# Altium footprint library PCB_Lib_Devzone.PcbLib: 491 footprints (part 13 of 31)
Each footprint in its own frame and in the unit in brackets; x right, y up, seen from the top. Pads: shape width x height; smd on the part's side, far side on the other; paste and mask are expansions set on the pad; w line width, h text height; cw(c..) or ccw(c..) is an arc to the next point about the centre after c.
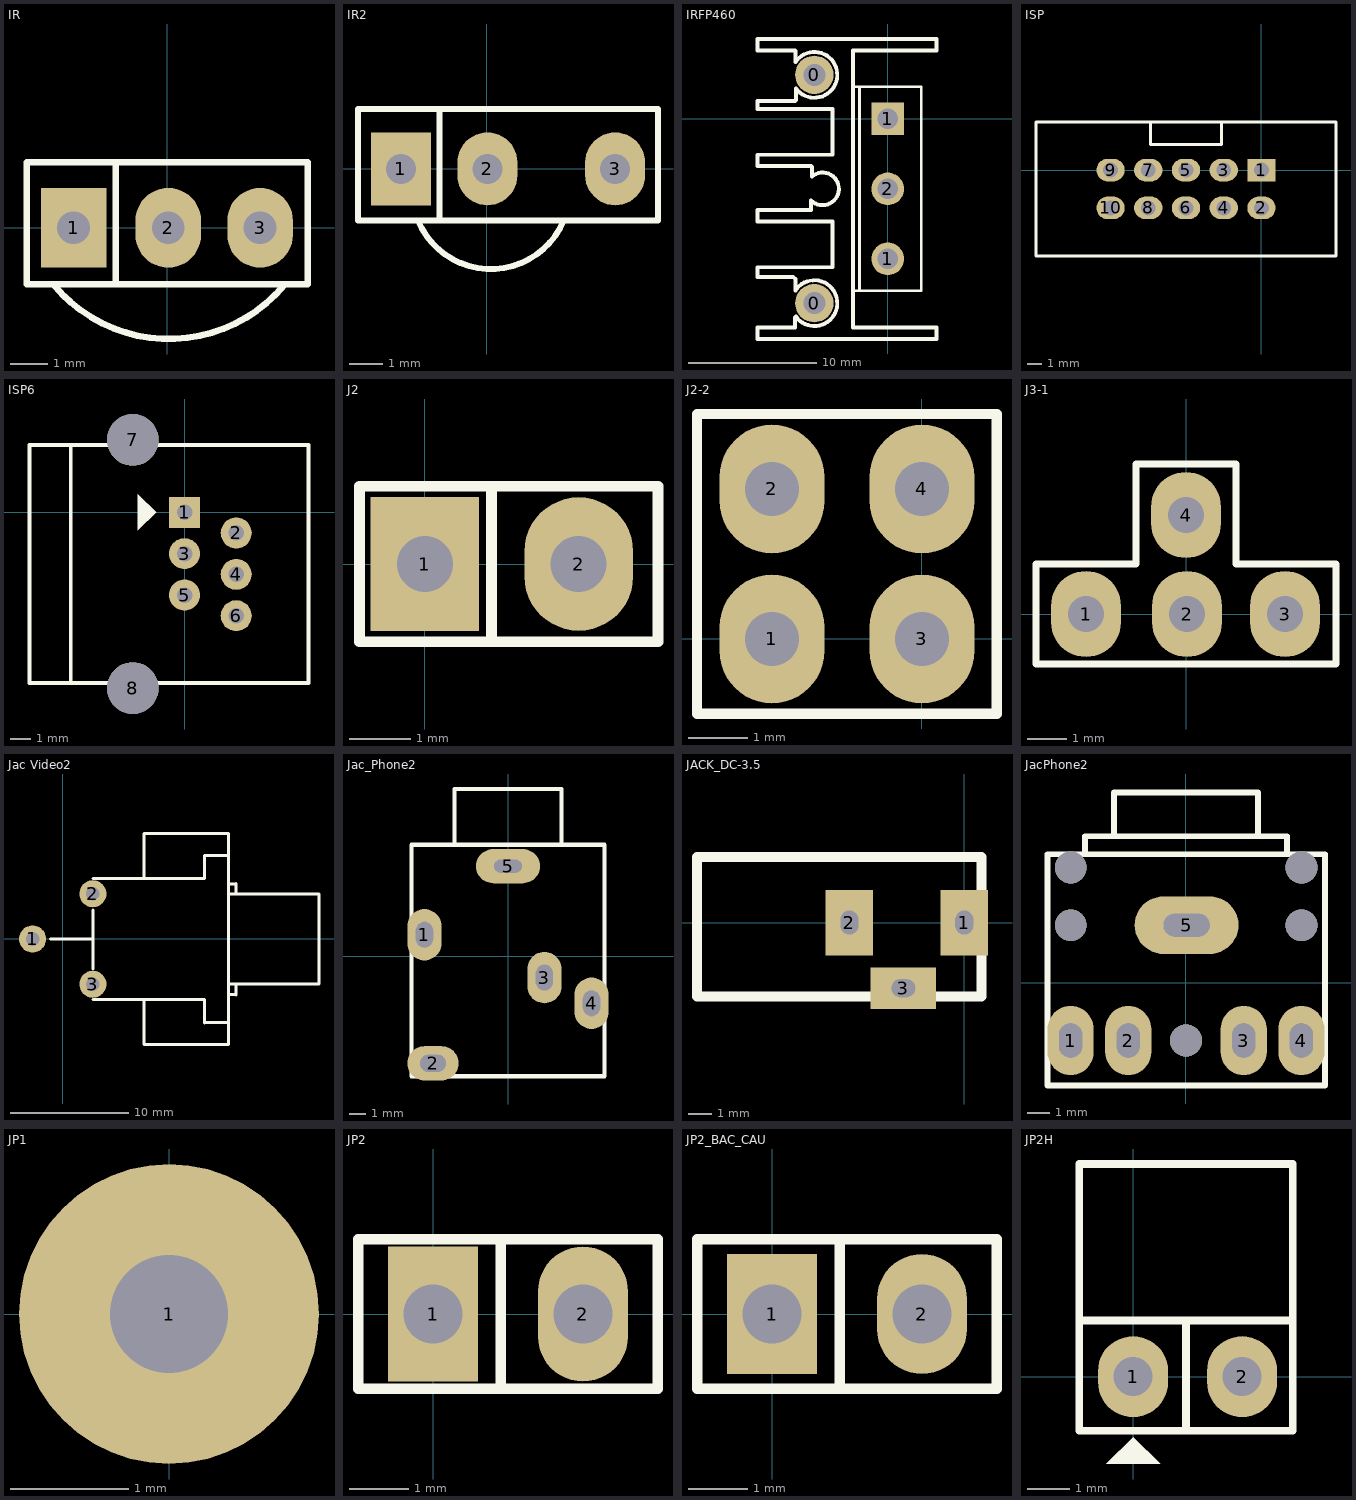
[diagram p12: the footprints below, top view; thin cyan lines are the x and y axes]

## IR [mil] "Receiver Infared IC"
height 200
pads (3):
  rect 70x85 hole 35: 1(-100,0)
  oval 70x85 hole 35: 2(1,0) 3(99,0)
Top Overlay:
  lines w7: -122,-60 ccw(c1.8,41.37) 124.86,-60.88 ; -55,-60 -55,70 ; -150,-60 -150,70 150,70 150,-60 -150,-60

## IR2 [mil] "Receiver Infared IC"
height 200
pads (3):
  rect 70x85 hole 35: 1(-100,0)
  oval 70x85 hole 35: 2(1,0) 3(150,0)
Top Overlay:
  lines w7: -80,-60 ccw(c5,-25) 90,-60 ; -55,-60 -55,70 ; -150,-60 -150,70 200,70 200,-60 -150,-60

## IRFP460 [mm]
pads (5):
  round 3 hole 1.7: 0(-5.715,-14.351) 0(-5.715,3.429)
  round 2.54 hole 1.6: 1(0,-10.9) 2(0,-5.45)
  rect 2.54x2.54 hole 1.6: 1(0,0)
Top Overlay:
  lines w0.2: -2.2,-13.4 -2.2,2.5 ; -2.7,-13.4 2.6,-13.4 2.6,2.5 -2.7,2.5 -2.7,-13.4
  lines w0.305: -2.7,2.159 -2.7,5.334 3.81,5.334 3.81,6.223 -10.16,6.223 -10.16,5.334 -7.239,5.334 -7.198,5.293 -7.198,4.418 cw(c-5.715,3.429) -7.157,2.381 -7.157,1.479 -7.239,1.397 -8.382,1.397 -10.16,1.397 -10.16,0.762 -4.318,0.762 -4.318,-2.794 -10.16,-2.794 -10.16,-3.683 -5.969,-3.683 -5.9,-3.752 -5.9,-4.48 cw(c-5.08,-5.45) -5.972,-6.354 -5.972,-7.109 -5.969,-7.112 -10.16,-7.112 -10.16,-8.001 -4.318,-8.001 -4.318,-11.557 -10.16,-11.557 -10.16,-12.319 -7.366,-12.319 -7.198,-12.487 -7.198,-13.362 cw(c-5.715,-14.351) -7.157,-15.399 -7.239,-15.482 -7.239,-16.256 -10.16,-16.256 -10.16,-17.145 3.81,-17.145 3.81,-16.256 -2.7,-16.256 -2.7,3.048

## ISP [mil]
pads (10):
  rect 75x60 hole 39.37 mask+8: 1(0,0)
  oval 75x60 hole 39.37 mask+8: 2(0,-100) 3(-100,0) 4(-100,-100) 5(-200,0) 6(-200,-100) 7(-300,0) 8(-300,-100) 9(-400,0) 10(-400,-100)
Top Overlay:
  lines w7.87: -294.49,127.17 -294.49,68.11 -105.51,68.11 -105.51,127.17 ; -597.64,-227.17 -597.64,127.17 197.64,127.17 197.64,-227.17 -597.64,-227.17
3D body "User Library-IDC Socket Male 10pin Straight THT Goldplated 2_54mm.STEP": height 363.39, standoff -124.8, extent -599.61,-231.11 199.61,117.31

## ISP6 [mil] "Jac nap PIC"
pads (8):
  rect 60x60 hole 30: 1(0,0)
  round 60 hole 30: 2(100,-40) 3(0,-80) 4(100,-120) 5(0,-160) 6(100,-200)
  round 100 hole 100: 7(-100,140) 8(-100,-340)
Top Overlay:
  region: -55,0 -90,35 -90,-35
  lines w7: -220,-330 -220,130
  lines w8: -300,-330 240,-330 240,130 -300,130 -300,-330

## J2 [mil] "Jum select vdd or gnd"
height 200
pads (2):
  rect 70x86 hole 36: 1(0,0)
  oval 70x86 hole 36: 2(99,0)
Top Overlay:
  lines w7: 43,-50 43,50 ; -42,-50 150,-50 150,50 -42,50 -42,-50
3D body "pin_header_aw140-eg-g02d.stp": height 422.83, standoff -18.11, extent -44,-49.36 156,49

## J2-2 [mil] "Jumper 4"
height 200
pads (4):
  oval 70x86 hole 36: 1(-100,0) 2(-100,100) 3(0,0) 4(0,100)
Top Overlay:
  lines w7: -150,-50 -150,50 -150,150 50,150 50,-50 -150,-50

## J3-1 [mil] "Jumper 4"
height 200
pads (4):
  oval 70x86 hole 36: 1(-100,0) 2(1,0) 3(99,0) 4(0,99)
Top Overlay:
  lines w7: -150,-50 150,-50 150,50 50,50 50,150 -50,150 -50,50 -150,50 -150,-50

## Jac Video2 [mil] "Jac Video Stereo"
pads (3):
  round 90 hole 45: 1(-100,0) 2(100,150) 3(100,-150)
Top Overlay:
  lines w10: -40,0 101,0 ; 100,-200 470,-200 ; 100,200 470,200 470,277 550,277 ; 101,-99 101,96 ; 270,200 270,350 550,350 ; 470,-277 548,-277 549,-276 ; 550,-277 550,-350 270,-350 ; 550,-150 850,-150 850,150 550,150 ; 551,-184 574,-184 575,-185 575,-151 ; 551,183 574,183 575,184 575,150 ; 270,-350 270,-200 270,-350 ; 470,-200 470,-278 470,-200 ; 550,277 550,350 ; 550,277 550,350 ; 550,-275 550,275 550,-275

## Jac_Phone2 [mil] "Jac Phone Stereo"
pads (5):
  oval 80x120 hole 40 slot 60 at 90 deg: 1(-195,50) 3(85,-50) 4(195,-110)
  oval 120x80 hole 40 slot 60 at 0 deg: 2(-175,-250)
  oval 150x80 hole 30 slot 65 at 0 deg: 5(0,210)
Top Overlay:
  lines w10: -125,262 -125,390 125,390 125,262 ; 223,-280 -225,-280 ; -225,-280 -225,260 ; -225,-280 -225,260 ; -225,260 225,260 ; 225,260 225,-280 225,260

## JACK_DC-3.5 [mil]
pads (3):
  rect 80x110 hole 30 slot 40 at 90 deg: 1(0,0) 2(-192.91,0)
  rect 110x70 hole 30 slot 40 at 0 deg: 3(-102.36,-110.24)
Top Overlay:
  lines w17: -449,-124 29,-124 29,110 -449,110 -449,-124
3D body "pj-018h.stp": height 301.34, standoff -115.98, extent -439.35,-114 17.35,98.6

## JacPhone2 [mil] "Jac Phone Stereo"
pads (5):
  oval 80x120 hole 40 slot 60 at 90 deg: 1(-200,-100) 2(-100,-100) 3(100,-100) 4(200,-100)
  oval 180x100 hole 40 slot 80 at 0 deg: 5(1,100)
via 200,100 diameter 55 hole 55
via -200,100 diameter 55 hole 55
via 0,-100 diameter 55 hole 55
via 200,200 diameter 55 hole 55
via -200,200 diameter 55 hole 55
Top Overlay:
  lines w10: -240,219 -240,-178 ; -175,224 -175,254 175,254 175,226 174,225 ; -125,255 -125,330 125,330 ; 125,329 125,256 126,255 ; 240,-178 -240,-178 ; -240,-178 -240,223 241,223 241,-178 -240,-178
3D body "SW3dPS-CONNECTOR, PHONE JACK, STEREO, 3.5 MM, SEE-PLUS ST-3536-02HG.STEP": height 394.3, standoff -137.19, extent -239,-201.56 233.44,353.56

## JP1 [mm]
pads (1):
  round 2.54 hole 1: 1(0,0)

## JP2 [mil]
pads (2):
  rect 60x90 hole 39.37: 1(0,0)
  oval 60x90 hole 39.37: 2(100,0)
Top Overlay:
  lines w7: 45,-50 45,49 ; -50,-50 -50,50 150,50 150,-50 -50,-50
3D body "JP2.stp": height 323.44, standoff -117.51, extent -48.03,-50 148.03,48.43

## JP2_BAC_CAU [mil]
pads (2):
  rect 60x80 hole 39.37: 1(0,0)
  oval 60x80 hole 39.37: 2(100,0)
Top Overlay:
  lines w7: 45,-50 45,49 ; -50,-50 150,-50 150,50 -50,50 -50,-50
3D body "jumper_akspt_g-grey.stp": height 350.04, standoff 115, extent -48.03,-51.06 148.03,45
3D body "JP2.stp": height 323.44, standoff -117.51, extent -48.03,-50 148.03,48.43

## JP2H [mil]
pads (2):
  oval 65x75 hole 36: 1(0,0) 2(101,0)
Top Overlay:
  region: 0,-56 -25,-81 25,-81
  lines w7: 49,-50 49,49 ; 148,54 148,197 -50,197 -50,52 ; -50,52 148,52 148,-50 -50,-50 -50,52
3D body "JP2H.stp": height 99.03, standoff -93.89, extent -44.13,-14.29 148,424.29